# Altium footprint library cool_library.PcbLib: 1182 footprints (part 41 of 75)
Each footprint in its own frame and in the unit in brackets; x right, y up, seen from the top. Pads: shape width x height; smd on the part's side, far side on the other; paste and mask are expansions set on the pad; w line width, h text height; cw(c..) or ccw(c..) is an arc to the next point about the centre after c.
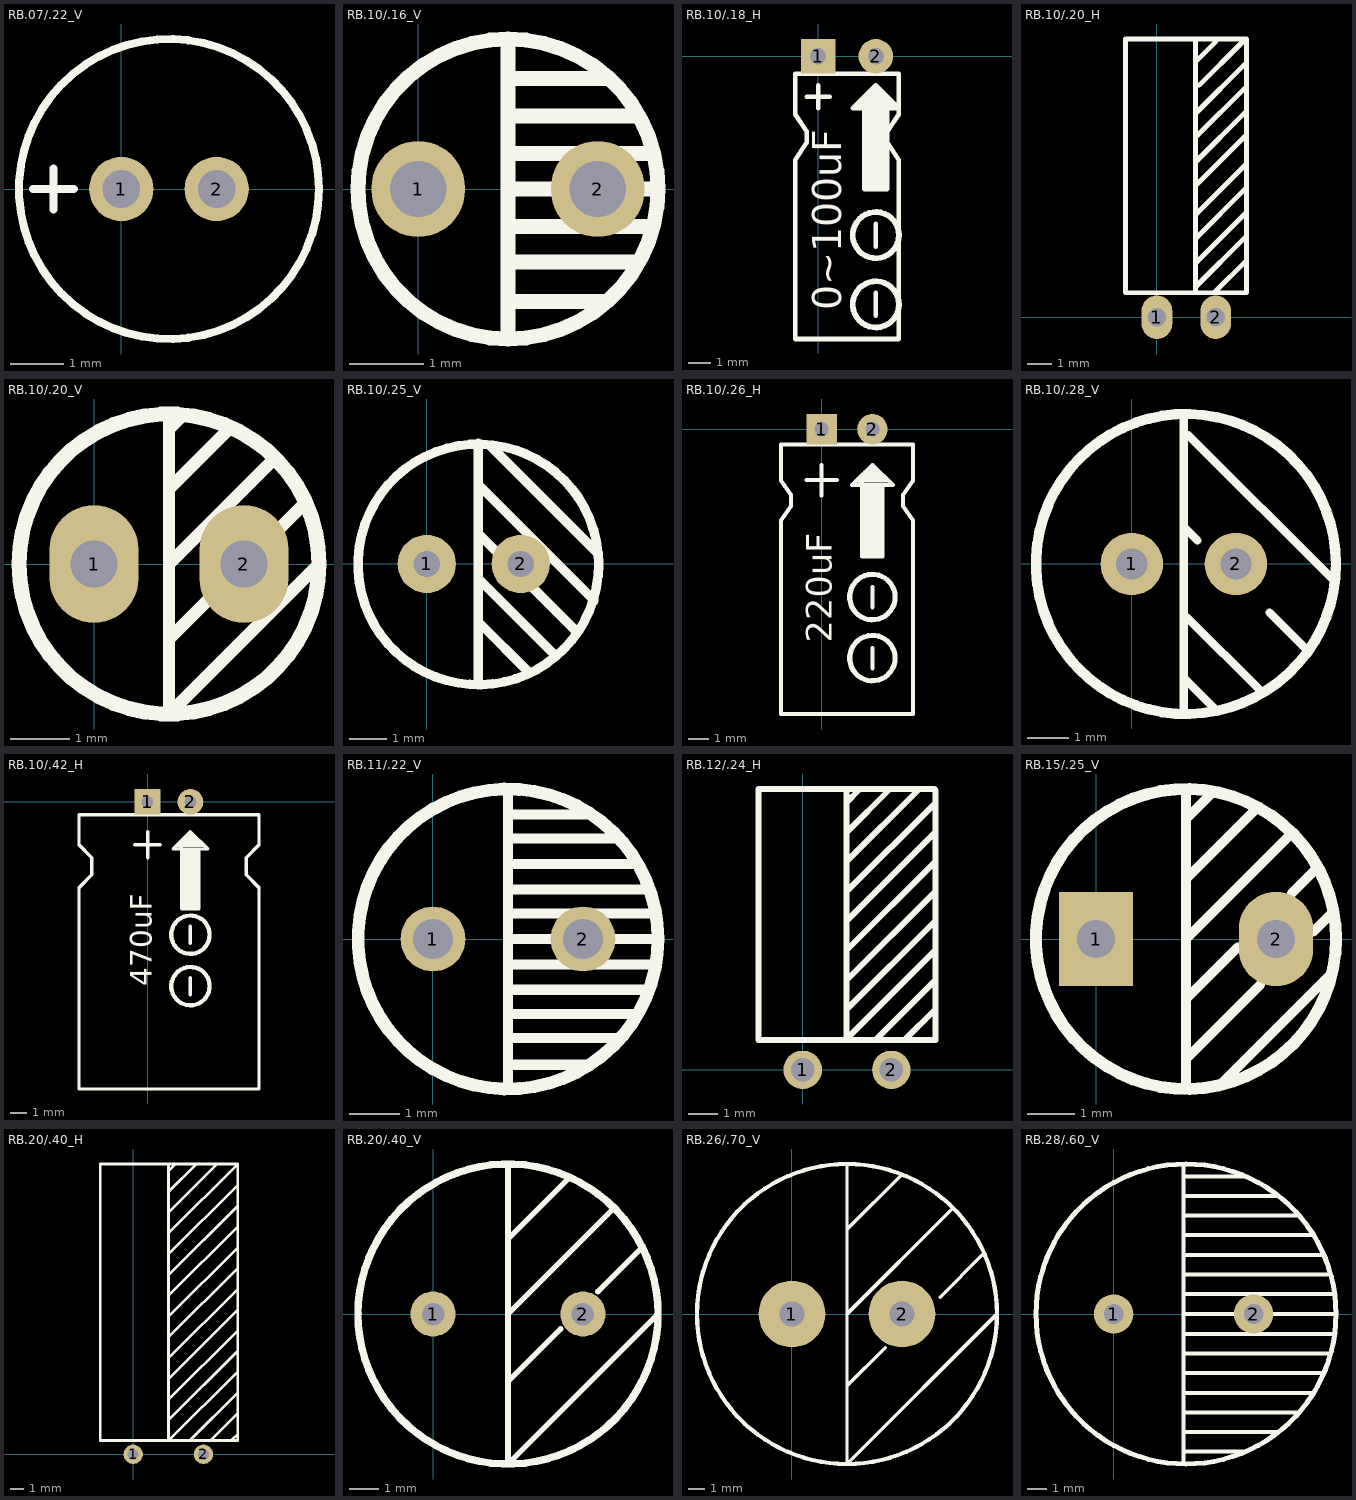
[diagram p40: the footprints below, top view; thin cyan lines are the x and y axes]

## RB.07/.22_V [mm]
pads (2):
  round 1.2 hole 0.7: 1(0,0) 2(1.778,0)
Top Overlay:
  circle w0.15: c0.889,0 r2.8
  lines w0.15: -1.651,0 -0.889,0 ; -1.27,-0.381 -1.27,0.381

## RB.10/.16_V [mm]
pads (2):
  oval 1.27x1.3 hole 0.762: 1(0,0) 2(2.432,0)
Top Overlay:
  circle w0.2: c1.216,0 r2.032
  lines w0.203: 1.216,-2.007 1.216,2.032 ; 1.216,-1.524 2.511,-1.524 ; 1.216,-0.991 2.969,-0.991 ; 1.216,-0.508 3.172,-0.508 ; 1.216,0 3.223,0 ; 1.216,0.483 3.172,0.483 ; 1.216,0.991 2.969,0.991 ; 1.216,1.499 2.537,1.499

## RB.10/.18_H [mil]
pads (2):
  rect 60x60 hole 28: 1(0,0)
  round 60 hole 28: 2(100,0)
Top Overlay:
  circle w10: c100,-430 r40
  circle w10: c100,-310 r40.01
  rectangle: 80,-230 120,-69
  rectangle: 91.16,-77 110,-58.84
  rectangle: 93.85,-69 106,-56.15
  rectangle: 77.32,-90 82,-72.68
  rectangle: 74.31,-90 78,-75.69
  rectangle: 71.24,-90 75,-78.76
  rectangle: 68.45,-90 72.83,-81.39
  rectangle: 65.75,-90 69.83,-84.08
  rectangle: 88.09,-69 93.85,-61.91
  rectangle: 85.46,-69 88.09,-64.54
  rectangle: 83.81,-69 85.62,-66.36
  rectangle: 117.83,-90 125.35,-75.51
  rectangle: 125,-90 131.15,-81.15
  rectangle: 129.83,-90 139.83,-84
  rectangle: 125,-81.15 128.08,-78.08
  rectangle: 117.83,-75.51 123.03,-73.2
  rectangle: 106,-69 113.74,-63.74
  rectangle: 113.57,-69 116.64,-66.81
  lines w8: -20,-70 20,-70 ; 0,-90 0,-50 ; 80,-90 80,-230 120,-230 120,-90 ; 100,-450 100,-410 ; 100,-330 100,-290 ; 100,-63 100,-50 ; 100,-50 60,-90 140,-90 100,-50 ; -40,-490 -40,-180 -20,-150 -20,-130 -40,-100 -40,-30 140,-30 140,-100 120,-130 120,-150 140,-180 140,-490 -40,-490
  text "0~100uF" at 40,-440 h50

## RB.10/.20_H [mm]
pads (2):
  oval 1.27x1.8 hole 0.762: 1(0,0) 2(2.432,0)
Top Overlay:
  lines w0.203: 1.594,1.029 1.594,11.516 ; 1.594,1.251 3.696,3.353 ; 1.594,2.235 3.696,4.337 ; 1.594,3.251 3.696,5.353 ; 1.594,4.242 3.696,6.344 ; 1.594,5.442 3.696,7.544 ; 1.594,6.426 3.696,8.528 ; 1.594,7.442 3.696,9.544 ; 1.594,8.433 3.696,10.535 ; 1.67,10.643 2.451,11.424 ; 1.746,9.601 3.518,11.373 ; 2.381,1.029 3.696,2.343 ; -1.298,1.016 3.702,1.016 3.702,11.516 -1.298,11.516 -1.298,1.016

## RB.10/.20_V [mm]
pads (2):
  oval 1.5x2 hole 0.8: 1(0,0) 2(2.54,0)
Top Overlay:
  circle w0.254: c1.27,0 r2.54
  lines w0.203: 1.27,-1.27 2.032,-0.508 ; 1.27,0 3.048,1.778 ; 1.27,1.27 2.286,2.286 ; 1.27,2.286 1.524,2.54 ; 1.27,2.54 1.27,-2.54 3.81,0 ; 3.048,0.508 3.556,1.016

## RB.10/.25_V [mil]
pads (2):
  round 62 hole 28: 1(0,0) 2(100,0)
Top Overlay:
  circle w10: c54.79,-0.54 r128.06
  lines w10: 54.73,-128.54 54.73,128.46 ; 54.73,-61.54 109.73,-116.54 ; 54.73,-15.54 136.73,-97.54 ; 54.73,32.46 159.73,-72.54 159.73,-73.54 ; 54.73,84.46 177.73,-38.54 177.73,-39.54 ; 66.73,126.46 182.73,10.46

## RB.10/.26_H [mil]
pads (2):
  rect 60x60 hole 28: 1(0,0)
  round 60 hole 28: 2(100,0)
Top Overlay:
  circle w10: c100,-450 r44.72
  circle w10: c100,-330 r44.72
  rectangle: 80,-250 120,-210
  rectangle: 80,-240 120,-110
  lines w8: -30,-100 30,-100 ; 0,-130 0,-70 ; 71.81,-99.88 80,-108.06 80,-110 80,-250 110,-250 120,-250 120,-110 ; 78.15,-101.15 131.15,-101.15 ; 79.21,-94.61 124.61,-94.61 ; 80.87,-89.13 119.13,-89.13 ; 85.93,-84.07 114.07,-84.07 ; 91.2,-78.8 108.8,-78.8 ; 100,-470 100,-430 ; 100,-350 100,-310 ; -80,-560 -80,-180 -60,-150 -60,-130 -80,-100 -80,-30 180,-30 180,-100 160,-130 160,-150 180,-180 180,-560 -80,-560 ; 60,-110 100,-70 140,-110 70,-110 60,-110
  text "220uF" at 20,-420 h50

## RB.10/.28_V [mil]
pads (2):
  round 60 hole 30: 1(0,0) 2(100,0)
Top Overlay:
  circle w10: c52,0 r144
  lines w8: 49.92,-143.66 49.92,142.24 ; 49.92,-109.37 78.94,-138.39 ; 50.94,34.65 63.11,22.48 ; 52.56,-50.83 124.29,-122.56 ; 54.13,123.78 194.45,-16.54 ; 132.2,-46.61 169.65,-84.06

## RB.10/.42_H [mil]
pads (2):
  rect 60x60 hole 28: 1(0,0)
  round 60 hole 28: 2(100,0)
Top Overlay:
  circle w10: c100,-430 r44.72
  circle w10: c100,-310 r44.72
  rectangle: 80,-250 120,-210
  rectangle: 80,-240 120,-110
  lines w8: -30,-100 30,-100 ; 0,-130 0,-70 ; 71.81,-99.88 80,-108.06 80,-110 80,-250 110,-250 120,-250 120,-110 ; 78.15,-101.15 131.15,-101.15 ; 79.21,-94.61 124.61,-94.61 ; 80.87,-89.13 119.13,-89.13 ; 85.93,-84.07 114.07,-84.07 ; 91.2,-78.8 108.8,-78.8 ; 100,-450 100,-410 ; 100,-330 100,-290 ; -160,-670 -160,-200 -130,-170 -130,-130 -160,-100 -160,-30 260,-30 260,-100 230,-130 230,-170 260,-200 260,-670 -160,-670 ; 60,-110 100,-70 140,-110 70,-110 60,-110
  text "470uF" at 10,-430 h50

## RB.11/.22_V [mm]
pads (2):
  round 1.3 hole 0.8: 1(0,0) 2(3,0)
Top Overlay:
  circle w0.254: c1.5,0 r3
  lines w0.203: 1.5,-3 1.5,3 ; 1.5,-2.515 3.103,-2.515 ; 1.5,-1.981 3.713,-1.981 ; 1.5,-1.499 4.068,-1.499 ; 1.5,-1.016 4.322,-1.016 ; 1.5,-0.508 4.449,-0.508 ; 1.5,0 4.5,0 ; 1.5,0.508 4.475,0.508 ; 1.5,0.991 4.348,0.991 ; 1.5,1.499 4.119,1.499 ; 1.5,2.007 3.738,2.007 ; 1.5,2.489 3.179,2.489

## RB.12/.24_H [mm]
pads (2):
  round 1.3 hole 0.8: 1(0,0) 2(3,0)
Top Overlay:
  lines w0.203: -1.504,1.016 -1.5,9.504 4.452,9.504 4.5,9.456 4.501,1.016 ; -1.5,1.016 4.5,1.016 ; 1.451,1.016 4.499,4.064 ; 1.476,1.016 1.476,9.478 ; 1.476,2.032 4.499,5.055 ; 1.476,3.023 4.499,6.045 ; 1.476,4.039 4.499,7.061 ; 1.476,5.029 4.499,8.052 ; 1.476,6.02 4.5,9.044 ; 1.476,7.036 3.944,9.504 ; 1.476,8.026 2.953,9.504 ; 1.476,9.042 1.937,9.504 ; 1.5,1.016 4.322,1.016 ; 2.467,1.016 4.499,3.048 ; 3.457,1.016 4.499,2.057

## RB.15/.25_V [mil]
pads (2):
  rect 62x78.74 hole 32: 1(0,0)
  oval 62x78.74 hole 32: 2(150,0)
Top Overlay:
  circle w10: c75,0 r125
  lines w8: 75,-125 75,125 ; 75,-100 137,-38 ; 75,-50 118,-7 ; 75,0 163,88 ; 75,50 134,109 ; 75,100 97,122 ; 104,-121 196,-29 ; 163,38 184,59 ; 181,6 197,22

## RB.20/.40_H [mm]
pads (2):
  round 1.4 hole 0.8: 1(0,0) 2(5.08,0)
Top Overlay:
  lines w0.203: 2.565,2.489 7.569,7.493 ; 2.565,3.962 7.569,8.966 ; 2.565,5.461 7.569,10.465 ; 2.565,6.96 7.569,11.963 ; 2.565,8.484 7.569,13.487 ; 2.565,9.957 7.569,14.961 ; 2.565,11.481 7.569,16.485 ; 2.565,12.979 7.569,17.983 ; 2.565,14.478 7.569,19.482 ; 2.565,15.996 7.569,21 ; 2.565,17.495 6.071,21 ; 2.565,18.993 4.572,21 ; 2.565,20.492 3.073,21 ; 2.565,21 2.565,1 7.569,6.004 ; 4.089,1 7.569,4.48 ; 5.588,1 7.569,2.981 ; 7.087,1 7.569,1.483 ; 7.544,1 -2.388,1 -2.388,21 7.569,21 ; 7.569,1 7.569,21

## RB.20/.40_V [mil]
pads (2):
  round 60 hole 30: 1(0,0) 2(200,0)
Top Overlay:
  circle w10: c100,0 r200
  lines w8: 100,-90 170,-20 ; 100,0 240,140 ; 100,100 180,180 ; 100,200 100,-200 300,0 ; 220,30 280,90

## RB.26/.70_V [mm]
pads (2):
  round 4 hole 1.5: 1(0,0) 2(6.604,0)
Top Overlay:
  circle w0.254: c3.302,0 r9
  lines w0.203: 3.302,-4.318 5.588,-2.032 ; 3.302,0 9.652,6.35 ; 3.302,5.08 6.604,8.382 ; 3.302,8.89 3.302,-8.89 3.412,-8.89 12.302,0 ; 8.89,1.016 11.43,3.556

## RB.28/.60_V [mm]
pads (2):
  round 2 hole 1: 1(0,0) 2(7.112,0)
Top Overlay:
  circle w0.254: c3.676,0 r7.62
  lines w0.203: 3.556,-7.62 3.556,7.62 ; 3.556,-6.985 6.706,-6.985 ; 3.556,-5.994 8.331,-5.994 ; 3.556,-5.004 9.423,-5.004 ; 3.556,-4.013 10.109,-4.013 ; 3.556,-2.997 10.668,-2.997 ; 3.556,-2.007 11.024,-2.007 ; 3.556,-1.016 11.252,-1.016 ; 3.556,0 11.252,0 ; 3.556,1.016 11.252,1.016 ; 3.556,2.007 11.024,2.007 ; 3.556,2.997 10.668,2.997 ; 3.556,4.013 10.109,4.013 ; 3.556,5.004 9.423,5.004 ; 3.556,5.994 8.331,5.994 ; 3.556,6.985 6.706,6.985